# Altium footprint library Reflow3D1411sep.PcbLib: 657 footprints (part 26 of 42)
Each footprint in its own frame and in the unit in brackets; x right, y up, seen from the top. Pads: shape width x height; smd on the part's side, far side on the other; paste and mask are expansions set on the pad; w line width, h text height; cw(c..) or ccw(c..) is an arc to the next point about the centre after c.
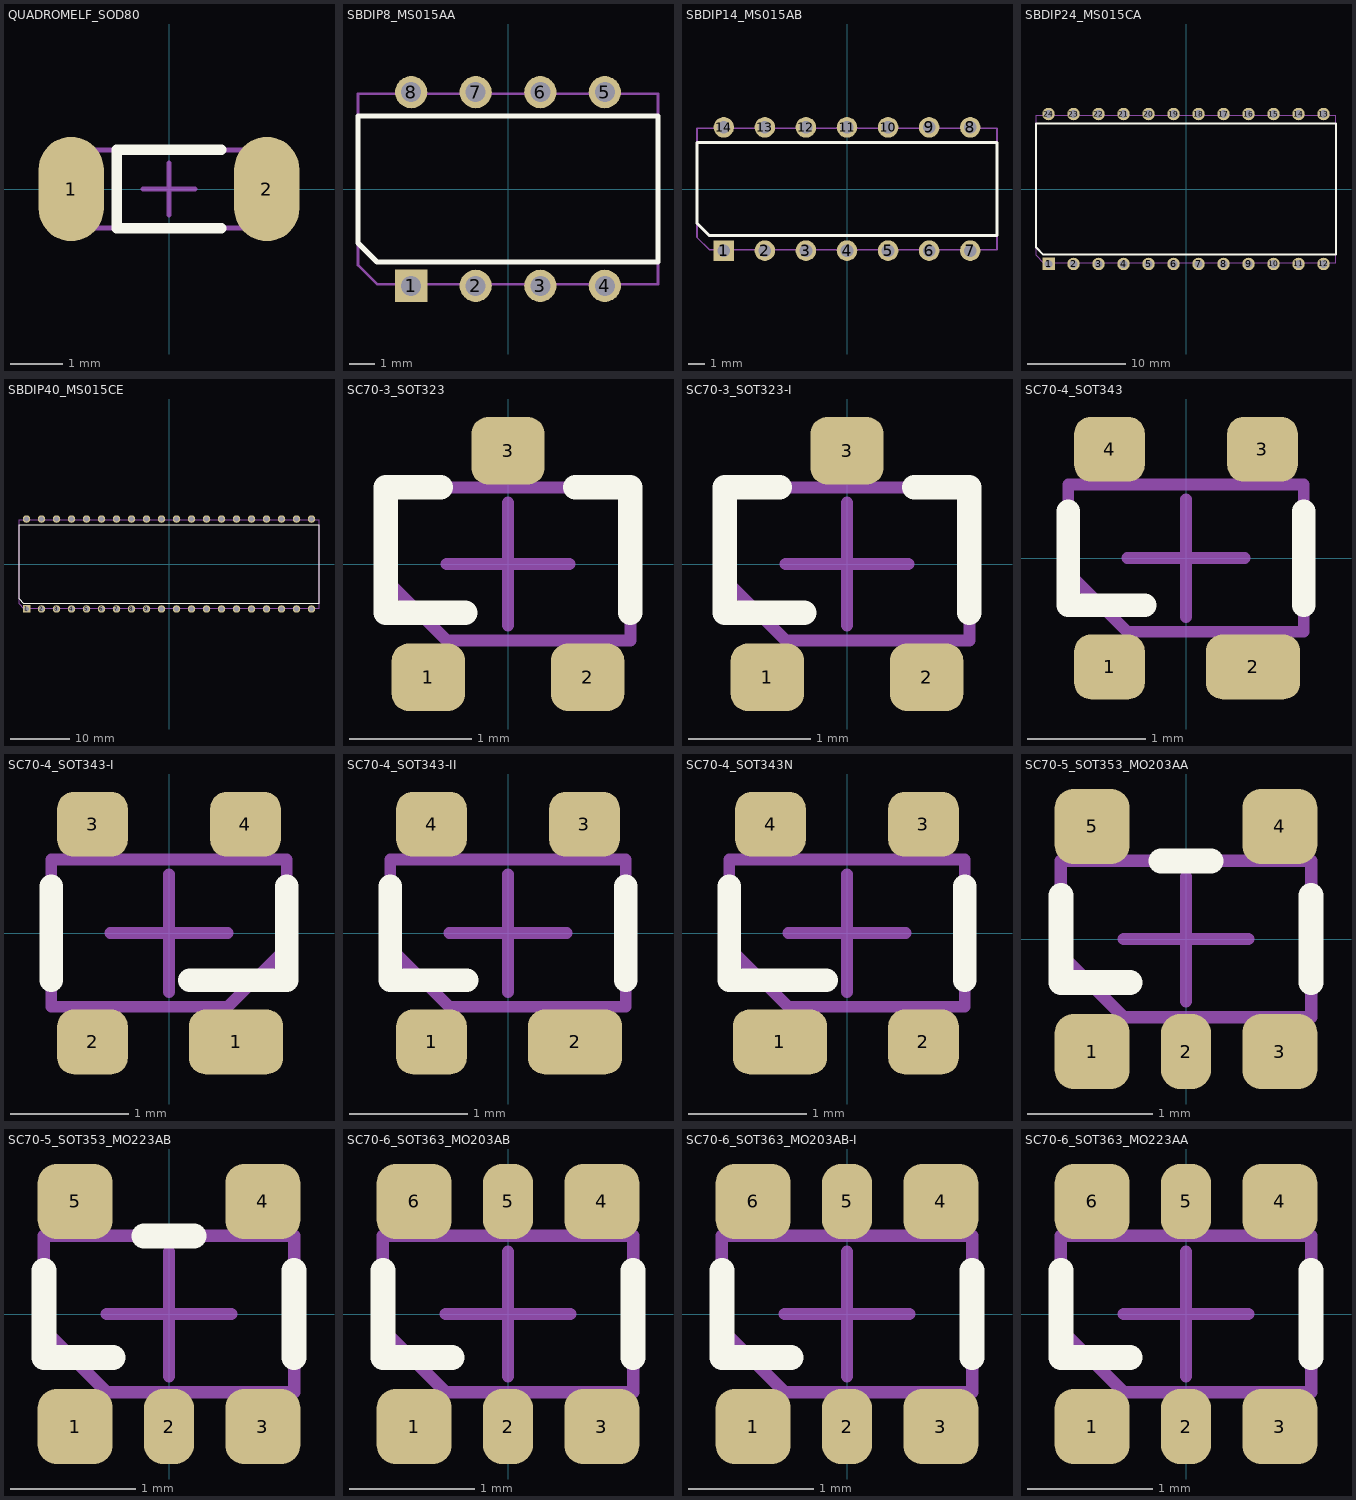
[diagram p25: the footprints below, top view; thin cyan lines are the x and y axes]

## QUADROMELF_SOD80 [mm] "www.vishay.com, ba982ba9.pdf"
height 1.5
pads (2):
  oval 1.25x2 smd mask+0.075: 1(-1.875,0) 2(1.875,0)
Top Overlay:
  lines w0.2: 1,-0.75 -1,-0.75 -1,0.75 1,0.75
Mechanical 13:
  lines w0.1: -1,-0.75 -1,0.75 ; -1.75,-0.75 -1.75,0.75 1.75,0.75 1.75,-0.75 -1.75,-0.75
Mechanical 15:
  lines w0.1: -0.5,0 0.5,0 ; 0,-0.5 0,0.5
3D body: height 1.6, standoff 0, extent -1.85,-0.8 1.85,0.8

## SBDIP8_MS015AA [mil] "www.ti.com, mcdi041a.pdf, JD8.asc"
height 140.16
pads (8):
  rect 50x50 hole 31: 1(-150,-150)
  round 50 hole 31: 2(-50,-150) 3(50,-150) 4(150,-150) 5(150,150) 6(50,150) 7(-50,150) 8(-150,150)
Top Overlay:
  lines w7.87: -232.48,-83.66 -202.95,-113.19 232.48,-113.19 232.48,113.19 -232.48,113.19 -232.48,-83.66
Mechanical 13:
  lines w3.94: -232.48,-117.91 -202.95,-147.44 232.48,-147.44 232.48,147.44 -232.48,147.44 -232.48,-117.91
3D body: height 175.2, standoff 0, extent -275,-154.92 275,154.92

## SBDIP14_MS015AB [mil] "www.ti.com, mcdi043a.pdf, JD14.asc"
height 140.16
pads (14):
  rect 50x50 hole 31: 1(-300,-150)
  round 50 hole 31: 2(-200,-150) 3(-100,-150) 4(0,-150) 5(100,-150) 6(200,-150) 7(300,-150) 8(300,150) 9(200,150) 10(100,150) 11(0,150) 12(-100,150) 13(-200,150) 14(-300,150)
Top Overlay:
  lines w7.87: -365.16,113.19 -365.16,-83.66 -335.63,-113.19 ; -364.96,113.19 364.96,113.19 364.96,-113.19 -335.43,-113.19
Mechanical 13:
  lines w3.94: -365.16,-117.91 -335.63,-147.44 365.16,-147.44 365.16,147.44 -365.16,147.44 -365.16,-117.91
3D body: height 175.2, standoff 0, extent -385.04,-154.92 385.04,154.92

## SBDIP24_MS015CA [mil] "www.ti.com, mcdi005.pdf, JD24.asc"
height 157.87
pads (24):
  rect 50x50 hole 31: 1(-550,-300)
  round 50 hole 31: 2(-450,-300) 3(-350,-300) 4(-250,-300) 5(-150,-300) 6(-50,-300) 7(50,-300) 8(150,-300) 9(250,-300) 10(350,-300) 11(450,-300) 12(550,-300) 13(550,300) 14(450,300) 15(350,300) 16(250,300) 17(150,300) 18(50,300) 19(-50,300) 20(-150,300) 21(-250,300) 22(-350,300) 23(-450,300) 24(-550,300)
Top Overlay:
  lines w7.87: -600,-233.27 -600,262.8 600,262.8 600,-262.8 -570.47,-262.8 -600,-233.27
Mechanical 13:
  lines w3.94: -600,-265.75 -600,295.28 600,295.28 600,-295.28 -570.47,-295.28 -600,-265.75
3D body: height 175.2, standoff 0, extent -625,-304.92 625,304.92

## SBDIP40_MS015CE [mil] "www.ti.com, mcdi005.pdf, JD40.asc"
height 157.87
pads (40):
  rect 50x50 hole 31: 1(-950,-300)
  round 50 hole 31: 2(-850,-300) 3(-750,-300) 4(-650,-300) 5(-550,-300) 6(-450,-300) 7(-350,-300) 8(-250,-300) 9(-150,-300) 10(-50,-300) 11(50,-300) 12(150,-300) 13(250,-300) 14(350,-300) 15(450,-300) 16(550,-300) 17(650,-300) 18(750,-300) 19(850,-300) 20(950,-300) 21(950,300) 22(850,300) 23(750,300) 24(650,300) 25(550,300) 26(450,300) 27(350,300) 28(250,300) 29(150,300) 30(50,300) 31(-50,300) 32(-150,300) 33(-250,300) 34(-350,300) 35(-450,300) 36(-550,300) 37(-650,300) 38(-750,300) 39(-850,300) 40(-950,300)
Top Overlay:
  lines w7.87: -1000,-233.27 -1000,262.8 1000,262.8 1000,-262.8 -970.47,-262.8 -1000,-233.27
Mechanical 13:
  lines w3.94: -1000,-265.75 -1000,295.28 1000,295.28 1000,-295.28 -970.47,-295.28 -1000,-265.75
3D body: height 175.2, standoff 0, extent -1025,-304.92 1025,304.92

## SC70-3_SOT323 [mm] "www.nxp.com, SOT323.pdf, SOT323_fr.pdf; www.maxim-ic.com, 21-0075.PDF"
height 0.95
pads (3):
  rrect50% 0.6x0.55 smd paste-25.4 mask+0.075: 1(-0.65,-0.925) 2(0.65,-0.925) 3(0,0.925)
Top Overlay:
  lines w0.2: -0.55,0.625 -1,0.625 -1,-0.4 -0.35,-0.4 ; 0.55,0.625 1,0.625 1,-0.4
Top Paste:
  region: -0.25,1.2 -0.25,0.65 0.25,0.65 0.25,1.2
  region: -0.9,-0.65 -0.9,-1.2 -0.4,-1.2 -0.4,-0.65
  region: 0.4,-0.65 0.4,-1.2 0.9,-1.2 0.9,-0.65
Mechanical 13:
  lines w0.1: -1,-0.125 -0.5,-0.625 1,-0.625 1,0.625 -1,0.625 -1,-0.125
Mechanical 15:
  lines w0.1: -0.5,0 0.5,0 ; 0,-0.5 0,0.5
3D body: height 1.1, standoff 0, extent -1.1,-0.675 1.1,0.675

## SC70-3_SOT323-I [mm] "www.nxp.com, SOP013.pdf, SOT323_fr.pdf"
height 0.9
pads (3):
  rrect50% 0.6x0.55 smd paste-25.4 mask+0.075: 1(-0.65,-0.925) 2(0.65,-0.925) 3(0,0.925)
Top Overlay:
  lines w0.2: -0.55,0.625 -1,0.625 -1,-0.4 -0.35,-0.4 ; 0.55,0.625 1,0.625 1,-0.4
Top Paste:
  region: -0.25,1.2 -0.25,0.65 0.25,0.65 0.25,1.2
  region: -0.9,-0.65 -0.9,-1.2 -0.4,-1.2 -0.4,-0.65
  region: 0.4,-0.65 0.4,-1.2 0.9,-1.2 0.9,-0.65
Mechanical 13:
  lines w0.1: -1,-0.125 -1,0.625 1,0.625 1,-0.625 -0.5,-0.625 -1,-0.125
Mechanical 15:
  lines w0.1: -0.5,0 0.5,0 ; 0,-0.5 0,0.5
3D body: height 1, standoff 0, extent -1.05,-0.675 1.05,0.675

## SC70-4_SOT343 [mm] "www.nxp.com, SOT343R_fr.pdf; www.onsemi.com, 419C-02.PDF"
height 0.95
pads (4):
  rrect50% 0.6x0.55 smd paste-25.4 mask+0.075: 1(-0.65,-0.925) 3(0.65,0.925) 4(-0.65,0.925)
  rrect50% 0.8x0.55 smd paste-25.4 mask+0.075: 2(0.57,-0.925)
Top Overlay:
  lines w0.2: -1,0.4 -1,-0.4 -0.35,-0.4 ; 1,-0.4 1,0.4
Top Paste:
  region: -0.9,1.2 -0.9,0.65 -0.4,0.65 -0.4,1.2
  region: -0.9,-0.65 -0.9,-1.2 -0.4,-1.2 -0.4,-0.65
  region: 0.225,-0.65 0.225,-1.2 0.925,-1.2 0.925,-0.65
  region: 0.4,1.2 0.4,0.65 0.9,0.65 0.9,1.2
Mechanical 13:
  lines w0.1: -1,-0.125 -0.5,-0.625 1,-0.625 1,0.625 -1,0.625 -1,-0.125
Mechanical 15:
  lines w0.1: -0.5,0 0.5,0 ; 0,-0.5 0,0.5
3D body: height 1.1, standoff 0, extent -1.1,-0.675 1.1,0.675

## SC70-4_SOT343-I [mm] "www.nxp.com, sot343r_po.pdf, SOT343R_fr.pdf"
height 0.95
pads (4):
  rrect50% 0.8x0.55 smd paste-25.4 mask+0.075: 1(0.57,-0.925)
  rrect50% 0.6x0.55 smd paste-25.4 mask+0.075: 2(-0.65,-0.925) 3(-0.65,0.925) 4(0.65,0.925)
Top Overlay:
  lines w0.2: -1,-0.4 -1,0.4 ; 0.175,-0.4 1,-0.4 1,0.4
Top Paste:
  region: 0.4,1.2 0.4,0.65 0.9,0.65 0.9,1.2
  region: 0.225,-0.65 0.225,-1.2 0.925,-1.2 0.925,-0.65
  region: -0.9,-0.65 -0.9,-1.2 -0.4,-1.2 -0.4,-0.65
  region: -0.9,1.2 -0.9,0.65 -0.4,0.65 -0.4,1.2
Mechanical 13:
  lines w0.1: -1,-0.625 -1,0.625 1,0.625 1,-0.125 0.5,-0.625 -1,-0.625
Mechanical 15:
  lines w0.1: -0.5,0 0.5,0 ; 0,-0.5 0,0.5
3D body: height 1.1, standoff 0, extent -1.1,-0.675 1.1,0.675

## SC70-4_SOT343-II [mm] "www.nxp.com, SOT343R_fr.pdf; www.maxim-ic.com, 21-0098.PDF"
height 0.95
pads (4):
  rrect50% 0.6x0.55 smd paste-25.4 mask+0.075: 1(-0.65,-0.925) 3(0.65,0.925) 4(-0.65,0.925)
  rrect50% 0.8x0.55 smd paste-25.4 mask+0.075: 2(0.57,-0.925)
Top Overlay:
  lines w0.2: -1,0.4 -1,-0.4 -0.35,-0.4 ; 1,-0.4 1,0.4
Top Paste:
  region: -0.9,1.2 -0.9,0.65 -0.4,0.65 -0.4,1.2
  region: -0.9,-0.65 -0.9,-1.2 -0.4,-1.2 -0.4,-0.65
  region: 0.225,-0.65 0.225,-1.2 0.925,-1.2 0.925,-0.65
  region: 0.4,1.2 0.4,0.65 0.9,0.65 0.9,1.2
Mechanical 13:
  lines w0.1: -1,-0.125 -0.5,-0.625 1,-0.625 1,0.625 -1,0.625 -1,-0.125
Mechanical 15:
  lines w0.1: -0.5,0 0.5,0 ; 0,-0.5 0,0.5
3D body: height 1.1, standoff 0, extent -1.125,-0.675 1.125,0.675

## SC70-4_SOT343N [mm] "www.nxp.com, sot343n_po.pdf, SOT343N_fr.pdf"
height 0.95
pads (4):
  rrect50% 0.8x0.55 smd paste-25.4 mask+0.075: 1(-0.57,-0.925)
  rrect50% 0.6x0.55 smd paste-25.4 mask+0.075: 2(0.65,-0.925) 3(0.65,0.925) 4(-0.65,0.925)
Top Overlay:
  lines w0.2: -1,0.4 -1,-0.4 -0.175,-0.4 ; 1,-0.4 1,0.4
Top Paste:
  region: 0.4,1.2 0.4,0.65 0.9,0.65 0.9,1.2
  region: -0.925,-0.65 -0.925,-1.2 -0.225,-1.2 -0.225,-0.65
  region: 0.4,-0.65 0.4,-1.2 0.9,-1.2 0.9,-0.65
  region: -0.9,1.2 -0.9,0.65 -0.4,0.65 -0.4,1.2
Mechanical 13:
  lines w0.1: -1,-0.125 -1,0.625 1,0.625 1,-0.625 -0.5,-0.625 -1,-0.125
Mechanical 15:
  lines w0.1: -0.5,0 0.5,0 ; 0,-0.5 0,0.5
3D body: height 1.1, standoff 0, extent -1.1,-0.675 1.1,0.675

## SC70-5_SOT353_MO203AA [mm] "www.nxp.com, SOT353_fr.pdf; www.maxim-ic.com, 21-0076.PDF; www.jedec.org, Mo-203b.PDF"
height 0.95
pads (5):
  rrect50% 0.6x0.6 smd mask+0.05: 1(-0.75,-0.9) 3(0.75,-0.9) 4(0.75,0.9) 5(-0.75,0.9)
  rrect75% 0.4x0.6 smd paste+0 mask+0.05: 2(0,-0.9)
Top Overlay:
  lines w0.2: -1,0.35 -1,-0.35 -0.45,-0.35 ; -0.2,0.625 0.2,0.625 ; 1,-0.35 1,0.35
Mechanical 13:
  lines w0.1: -1,-0.125 -1,0.625 1,0.625 1,-0.625 -0.5,-0.625 -1,-0.125
Mechanical 15:
  lines w0.1: -0.5,0 0.5,0 ; 0,-0.5 0,0.5
3D body: height 1.1, standoff 0, extent -1.1,-0.675 1.1,0.675

## SC70-5_SOT353_MO223AB [mm] "www.nxp.com, sot353_po.pdf, SOT353_fr.pdf; www.jedec.org, MO-223A.pdf"
height 0.95
pads (5):
  rrect50% 0.6x0.6 smd mask+0.05: 1(-0.75,-0.9) 3(0.75,-0.9) 4(0.75,0.9) 5(-0.75,0.9)
  rrect75% 0.4x0.6 smd paste+0 mask+0.05: 2(0,-0.9)
Top Overlay:
  lines w0.2: -1,0.35 -1,-0.35 -0.45,-0.35 ; -0.2,0.625 0.2,0.625 ; 1,-0.35 1,0.35
Mechanical 13:
  lines w0.1: -1,-0.125 -0.5,-0.625 1,-0.625 1,0.625 -1,0.625 -1,-0.125
Mechanical 15:
  lines w0.1: -0.5,0 0.5,0 ; 0,-0.5 0,0.5
3D body: height 1.1, standoff 0, extent -1.1,-0.675 1.1,0.675

## SC70-6_SOT363_MO203AB [mm] "www.nxp.com, SOT363_fr.pdf; www.fairchildsemi.com, sc706_dim.pdf; www.jedec.org, Mo-203b.PDF"
height 0.95
pads (6):
  rrect50% 0.6x0.6 smd mask+0.05: 1(-0.75,-0.9) 3(0.75,-0.9) 4(0.75,0.9) 6(-0.75,0.9)
  rrect75% 0.4x0.6 smd paste+0 mask+0.05: 2(0,-0.9) 5(0,0.9)
Top Overlay:
  lines w0.2: -1,0.35 -1,-0.35 -0.45,-0.35 ; 1,-0.35 1,0.35
Mechanical 13:
  lines w0.1: -1,-0.125 -1,0.625 1,0.625 1,-0.625 -0.5,-0.625 -1,-0.125
Mechanical 15:
  lines w0.1: -0.5,0 0.5,0 ; 0,-0.5 0,0.5
3D body: height 1.1, standoff 0, extent -1.1,-0.675 1.1,0.675

## SC70-6_SOT363_MO203AB-I [mm] "www.nxp.com, SOT363_fr.pdf; www.maxim-ic.com, 21-0077.PDF; www.jedec.org, Mo-203b.PDF"
height 0.95
pads (6):
  rrect50% 0.6x0.6 smd mask+0.05: 1(-0.75,-0.9) 3(0.75,-0.9) 4(0.75,0.9) 6(-0.75,0.9)
  rrect75% 0.4x0.6 smd paste+0 mask+0.05: 2(0,-0.9) 5(0,0.9)
Top Overlay:
  lines w0.2: -1,0.35 -1,-0.35 -0.45,-0.35 ; 1,-0.35 1,0.35
Mechanical 13:
  lines w0.1: -1,-0.125 -0.5,-0.625 1,-0.625 1,0.625 -1,0.625 -1,-0.125
Mechanical 15:
  lines w0.1: -0.5,0 0.5,0 ; 0,-0.5 0,0.5
3D body: height 1.1, standoff 0, extent -1.075,-0.675 1.075,0.675

## SC70-6_SOT363_MO223AA [mm] "www.nxp.com, SOT363.pdf, SOT363_fr.pdf; www.jedec.org, MO-223A.pdf"
height 0.95
pads (6):
  rrect50% 0.6x0.6 smd mask+0.05: 1(-0.75,-0.9) 3(0.75,-0.9) 4(0.75,0.9) 6(-0.75,0.9)
  rrect75% 0.4x0.6 smd paste+0 mask+0.05: 2(0,-0.9) 5(0,0.9)
Top Overlay:
  lines w0.2: -1,0.35 -1,-0.35 -0.45,-0.35 ; 1,-0.35 1,0.35
Mechanical 13:
  lines w0.1: -1,-0.125 -1,0.625 1,0.625 1,-0.625 -0.5,-0.625 -1,-0.125
Mechanical 15:
  lines w0.1: -0.5,0 0.5,0 ; 0,-0.5 0,0.5
3D body: height 1.1, standoff 0, extent -1.1,-0.675 1.1,0.675